# Altium integrated library WE_WR-MPC4_Mini Power Connector_4.20 mm_rev15b.IntLib: 79 symbols
Pins are listed as number, name and electrical type; pins without a type are passive.

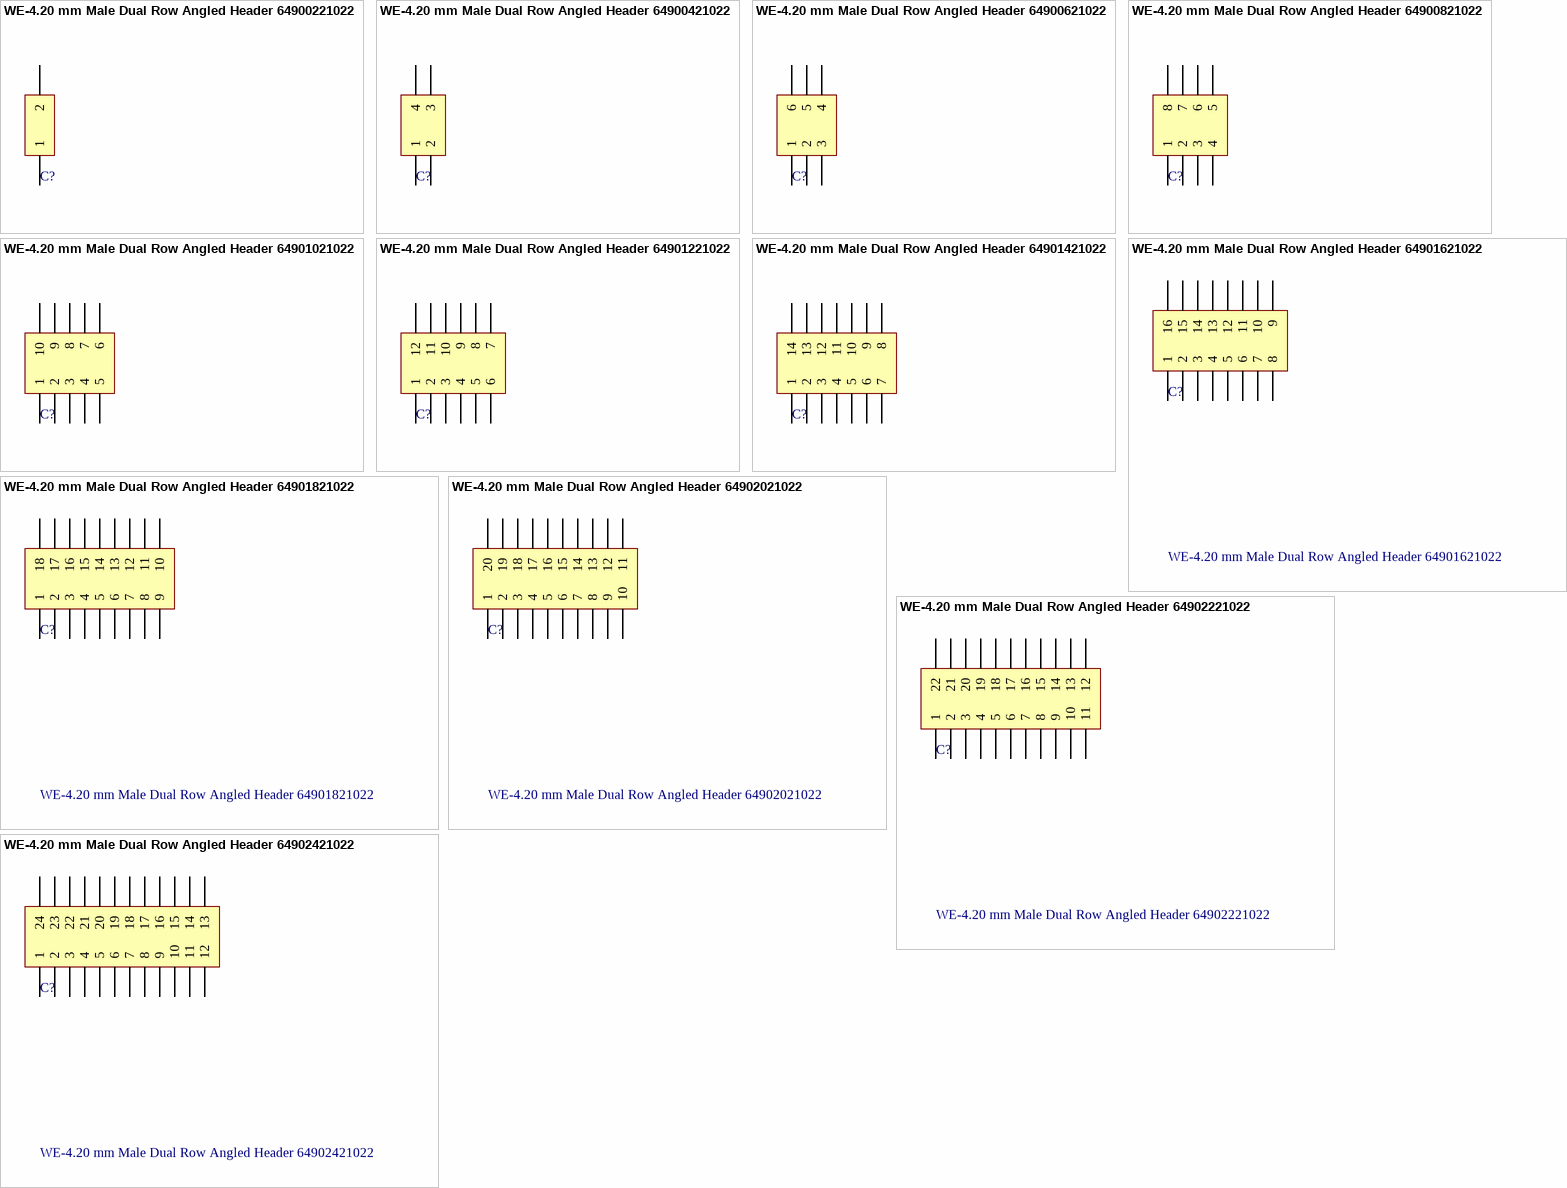
[diagram p0: symbols WE-4.20 mm Male Dual Row Angled Header 64900221022 to WE-4.20 mm Male Dual Row Angled Header 64902421022]

## WE-4.20 mm Male Dual Row Angled Header 64900221022
designator C?
WR-MPC4 Mini power connector; Manufacturer: Würth Elektronik eiSos GmbH; ComponentLink1 Description: Manufacturer; ComponentLink2 Description: Datasheet; NoPins: 02; Created Date: 5 August 2013; partNo: 64900221022; ComponentLink1URL: http://www.we-online.com; ComponentLink2URL: http://katalog.we-online.de/em/datasheet/6490xx21022.pdf; Created by: Karrer Zheng
footprint 64900221022 (Dual row Right angle header With mounting flanges 02p)
pins: 1, 2

## WE-4.20 mm Male Dual Row Angled Header 64900421022
designator C?
WR-MPC4 Mini power connector; Manufacturer: Würth Elektronik eiSos GmbH; ComponentLink1 Description: Manufacturer; ComponentLink2 Description: Datasheet; NoPins: 04; Created Date: 5 August 2013; partNo: 64900421022; ComponentLink1URL: http://www.we-online.com; ComponentLink2URL: http://katalog.we-online.de/em/datasheet/6490xx21022.pdf; Created by: Karrer Zheng
footprint 64900421022 (Dual row Right angle header With mounting flanges 04p)
pins: 1, 2, 3, 4

## WE-4.20 mm Male Dual Row Angled Header 64900621022
designator C?
WR-MPC4 Mini power connector; Manufacturer: Würth Elektronik eiSos GmbH; ComponentLink1 Description: Manufacturer; ComponentLink2 Description: Datasheet; NoPins: 06; Created Date: 5 August 2013; partNo: 64900621022; ComponentLink1URL: http://www.we-online.com; ComponentLink2URL: http://katalog.we-online.de/em/datasheet/6490xx21022.pdf; Created by: Karrer Zheng
footprint 64900621022 (Dual row Right angle header With mounting flanges 06p)
pins: 1, 2, 3, 4, 5, 6

## WE-4.20 mm Male Dual Row Angled Header 64900821022
designator C?
WR-MPC4 Mini power connector; Manufacturer: Würth Elektronik eiSos GmbH; ComponentLink1 Description: Manufacturer; ComponentLink2 Description: Datasheet; NoPins: 08; Created Date: 5 August 2013; partNo: 64900821022; ComponentLink1URL: http://www.we-online.com; ComponentLink2URL: http://katalog.we-online.de/em/datasheet/6490xx21022.pdf; Created by: Karrer Zheng
footprint 64900821022 (Dual row Right angle header With mounting flanges 08p)
pins: 1, 2, 3, 4, 5, 6, 7, 8

## WE-4.20 mm Male Dual Row Angled Header 64901021022
designator C?
WR-MPC4 Mini power connector; Manufacturer: Würth Elektronik eiSos GmbH; ComponentLink1 Description: Manufacturer; ComponentLink2 Description: Datasheet; NoPins: 10; Created Date: 5 August 2013; partNo: 64901021022; ComponentLink1URL: http://www.we-online.com; ComponentLink2URL: http://katalog.we-online.de/em/datasheet/6490xx21022.pdf; Created by: Karrer Zheng
footprint 64901021022 (Dual row Right angle header With mounting flanges 10p)
pins: 1, 2, 3, 4, 5, 6, 7, 8, 9, 10

## WE-4.20 mm Male Dual Row Angled Header 64901221022
designator C?
WR-MPC4 Mini power connector; Manufacturer: Würth Elektronik eiSos GmbH; ComponentLink1 Description: Manufacturer; ComponentLink2 Description: Datasheet; NoPins: 12; Created Date: 5 August 2013; partNo: 64901221022; ComponentLink1URL: http://www.we-online.com; ComponentLink2URL: http://katalog.we-online.de/em/datasheet/6490xx21022.pdf; Created by: Karrer Zheng
footprint 64901221022 (Dual row Right angle header With mounting flanges 12p)
pins: 1, 2, 3, 4, 5, 6, 7, 8, 9, 10, 11, 12

## WE-4.20 mm Male Dual Row Angled Header 64901421022
designator C?
WR-MPC4 Mini power connector; Manufacturer: Würth Elektronik eiSos GmbH; ComponentLink1 Description: Manufacturer; ComponentLink2 Description: Datasheet; NoPins: 14; Created Date: 5 August 2013; partNo: 64901421022; ComponentLink1URL: http://www.we-online.com; ComponentLink2URL: http://katalog.we-online.de/em/datasheet/6490xx21022.pdf; Created by: Karrer Zheng
footprint 64901421022 (Dual row Right angle header With mounting flanges 14p)
pins: 1, 2, 3, 4, 5, 6, 7, 8, 9, 10, 11, 12, 13, 14

## WE-4.20 mm Male Dual Row Angled Header 64901621022
designator C?
WR-MPC4 Mini power connector; Manufacturer: Würth Elektronik eiSos GmbH; ComponentLink1 Description: Manufacturer; ComponentLink2 Description: Datasheet; NoPins: 16; Created Date: 5 August 2013; partNo: 64901621022; ComponentLink1URL: http://www.we-online.com; ComponentLink2URL: http://katalog.we-online.de/em/datasheet/6490xx21022.pdf; Created by: Karrer Zheng
footprint 64901621022 (Dual row Right angle header With mounting flanges 16p)
pins: 1, 2, 3, 4, 5, 6, 7, 8, 9, 10, 11, 12, 13, 14, 15, 16

## WE-4.20 mm Male Dual Row Angled Header 64901821022
designator C?
WR-MPC4 Mini power connector; Manufacturer: Würth Elektronik eiSos GmbH; ComponentLink1 Description: Manufacturer; ComponentLink2 Description: Datasheet; NoPins: 18; Created Date: 5 August 2013; partNo: 64901821022; ComponentLink1URL: http://www.we-online.com; ComponentLink2URL: http://katalog.we-online.de/em/datasheet/6490xx21022.pdf; Created by: Karrer Zheng
footprint 64901821022 (Dual row Right angle header With mounting flanges 18p)
pins: 1, 2, 3, 4, 5, 6, 7, 8, 9, 10, 11, 12, 13, 14, 15, 16, 17, 18

## WE-4.20 mm Male Dual Row Angled Header 64902021022
designator C?
WR-MPC4 Mini power connector; Manufacturer: Würth Elektronik eiSos GmbH; ComponentLink1 Description: Manufacturer; ComponentLink2 Description: Datasheet; NoPins: 20; Created Date: 5 August 2013; partNo: 64902021022; ComponentLink1URL: http://www.we-online.com; ComponentLink2URL: http://katalog.we-online.de/em/datasheet/6490xx21022.pdf; Created by: Karrer Zheng
footprint 64902021022 (Dual row Right angle header With mounting flanges 20p)
pins: 1, 2, 3, 4, 5, 6, 7, 8, 9, 10, 11, 12, 13, 14, 15, 16, 17, 18, 19, 20

## WE-4.20 mm Male Dual Row Angled Header 64902221022
designator C?
WR-MPC4 Mini power connector; Manufacturer: Würth Elektronik eiSos GmbH; ComponentLink1 Description: Manufacturer; ComponentLink2 Description: Datasheet; NoPins: 22; Created Date: 5 August 2013; partNo: 64902221022; ComponentLink1URL: http://www.we-online.com; ComponentLink2URL: http://katalog.we-online.de/em/datasheet/6490xx21022.pdf; Created by: Karrer Zheng
footprint 64902221022 (Dual row Right angle header With mounting flanges 22p)
pins: 1, 2, 3, 4, 5, 6, 7, 8, 9, 10, 11, 12, 13, 14, 15, 16, 17, 18, 19, 20, 21, 22

## WE-4.20 mm Male Dual Row Angled Header 64902421022
designator C?
WR-MPC4 Mini power connector; Manufacturer: Würth Elektronik eiSos GmbH; ComponentLink1 Description: Manufacturer; ComponentLink2 Description: Datasheet; NoPins: 24; Created Date: 5 August 2013; partNo: 64902421022; ComponentLink1URL: http://www.we-online.com; ComponentLink2URL: http://katalog.we-online.de/em/datasheet/6490xx21022.pdf; Created by: Karrer Zheng
footprint 64902421022 (Dual row Right angle header With mounting flanges 24p)
pins: 1, 2, 3, 4, 5, 6, 7, 8, 9, 10, 11, 12, 13, 14, 15, 16, 17, 18, 19, 20, 21, 22, 23, 24


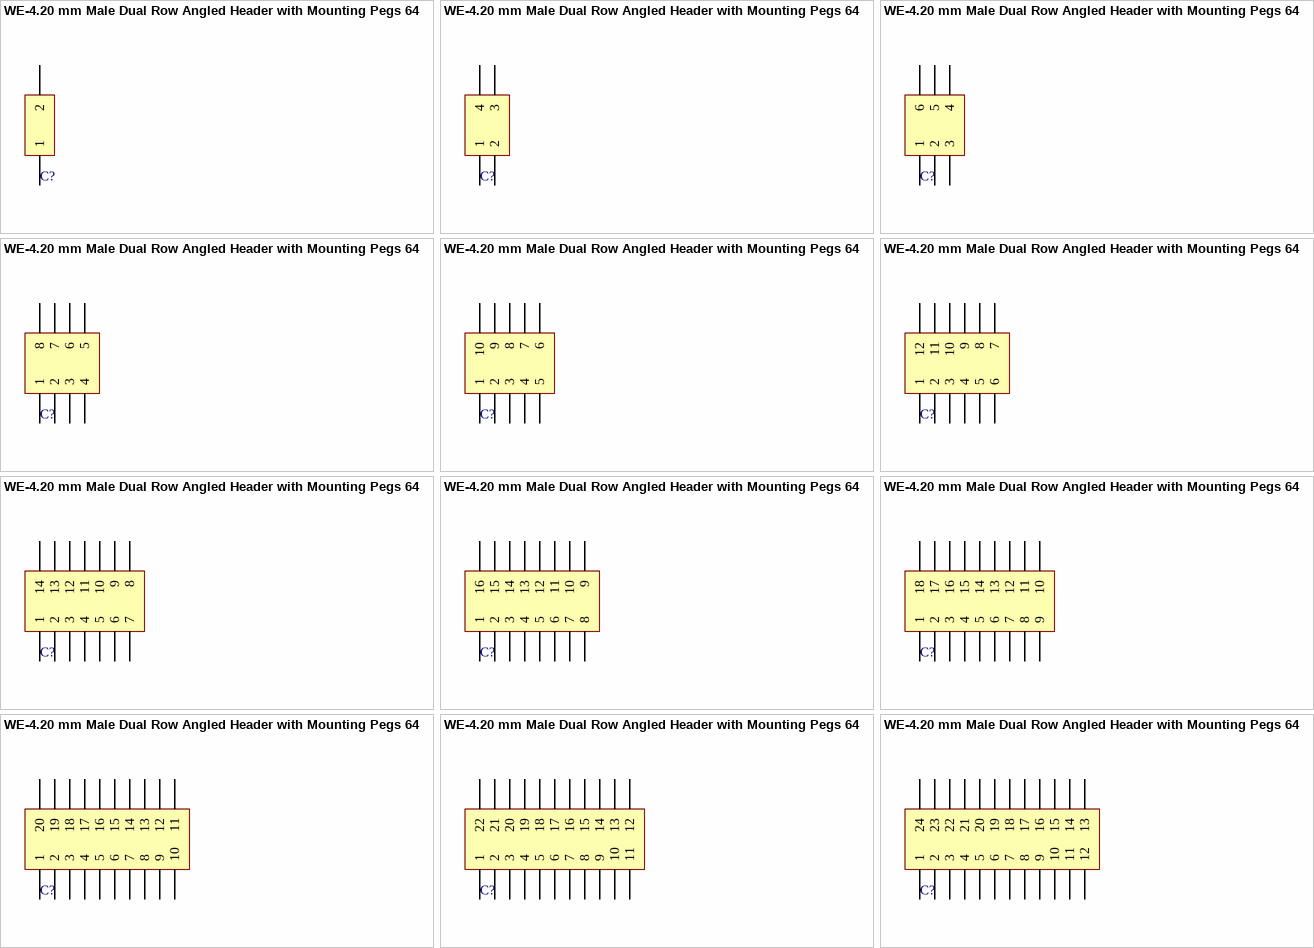
[diagram p1: symbols WE-4.20 mm Male Dual Row Angled Header with Mounting Pegs 649002227222 to WE-4.20 mm Male Dual Row Angled Header with Mounting Pegs 649024227222]

## WE-4.20 mm Male Dual Row Angled Header with Mounting Pegs 649002227222
designator C?
WR-MPC4 Mini power connector; Manufacturer: Würth Elektronik eiSos GmbH; ComponentLink1 Description: Manufacturer; ComponentLink2 Description: Datasheet; NoPins: 02; Created Date: 17 July 2013; partNo: 649002227222; ComponentLink1URL: http://www.we-online.com; ComponentLink2URL: http://katalog.we-online.de/em/datasheet/6490xx227222.pdf; Created by: Karrer Zheng
footprint 649002227222 (Dual Row Right angle header With mounting pegs 02p)
pins: 1, 2

## WE-4.20 mm Male Dual Row Angled Header with Mounting Pegs 649004227222
designator C?
WR-MPC4 Mini power connector; Manufacturer: Würth Elektronik eiSos GmbH; ComponentLink1 Description: Manufacturer; ComponentLink2 Description: Datasheet; NoPins: 04; Created Date: 17 July 2013; partNo: 649004227222; ComponentLink1URL: http://www.we-online.com; ComponentLink2URL: http://katalog.we-online.de/em/datasheet/6490xx227222.pdf; Created by: Karrer Zheng
footprint 649004227222 (Dual Row Right angle header With mounting pegs 04p)
pins: 1, 2, 3, 4

## WE-4.20 mm Male Dual Row Angled Header with Mounting Pegs 649006227222
designator C?
WR-MPC4 Mini power connector; Manufacturer: Würth Elektronik eiSos GmbH; ComponentLink1 Description: Manufacturer; ComponentLink2 Description: Datasheet; NoPins: 06; Created Date: 17 July 2013; partNo: 649006227222; ComponentLink1URL: http://www.we-online.com; ComponentLink2URL: http://katalog.we-online.de/em/datasheet/6490xx227222.pdf; Created by: Karrer Zheng
footprint 649006227222 (Dual Row Right angle header With mounting pegs 06p)
pins: 1, 2, 3, 4, 5, 6

## WE-4.20 mm Male Dual Row Angled Header with Mounting Pegs 649008227222
designator C?
WR-MPC4 Mini power connector; Manufacturer: Würth Elektronik eiSos GmbH; ComponentLink1 Description: Manufacturer; ComponentLink2 Description: Datasheet; NoPins: 08; Created Date: 17 July 2013; partNo: 649008227222; ComponentLink1URL: http://www.we-online.com; ComponentLink2URL: http://katalog.we-online.de/em/datasheet/6490xx227222.pdf; Created by: Karrer Zheng
footprint 649008227222 (Dual Row Right angle header With mounting pegs 08p)
pins: 1, 2, 3, 4, 5, 6, 7, 8

## WE-4.20 mm Male Dual Row Angled Header with Mounting Pegs 649010227222
designator C?
WR-MPC4 Mini power connector; Manufacturer: Würth Elektronik eiSos GmbH; ComponentLink1 Description: Manufacturer; ComponentLink2 Description: Datasheet; NoPins: 10; Created Date: 17 July 2013; partNo: 649010227222; ComponentLink1URL: http://www.we-online.com; ComponentLink2URL: http://katalog.we-online.de/em/datasheet/6490xx227222.pdf; Created by: Karrer Zheng
footprint 649010227222 (Dual Row Right angle header With mounting pegs 10p)
pins: 1, 2, 3, 4, 5, 6, 7, 8, 9, 10

## WE-4.20 mm Male Dual Row Angled Header with Mounting Pegs 649012227222
designator C?
WR-MPC4 Mini power connector; Manufacturer: Würth Elektronik eiSos GmbH; ComponentLink1 Description: Manufacturer; ComponentLink2 Description: Datasheet; NoPins: 12; Created Date: 17 July 2013; partNo: 649012227222; ComponentLink1URL: http://www.we-online.com; ComponentLink2URL: http://katalog.we-online.de/em/datasheet/6490xx227222.pdf; Created by: Karrer Zheng
footprint 649012227222 (Dual Row Right angle header With mounting pegs 12p)
pins: 1, 2, 3, 4, 5, 6, 7, 8, 9, 10, 11, 12

## WE-4.20 mm Male Dual Row Angled Header with Mounting Pegs 649014227222
designator C?
WR-MPC4 Mini power connector; Manufacturer: Würth Elektronik eiSos GmbH; ComponentLink1 Description: Manufacturer; ComponentLink2 Description: Datasheet; NoPins: 14; Created Date: 17 July 2013; partNo: 649014227222; ComponentLink1URL: http://www.we-online.com; ComponentLink2URL: http://katalog.we-online.de/em/datasheet/6490xx227222.pdf; Created by: Karrer Zheng
footprint 649014227222 (Dual Row Right angle header With mounting pegs 14p)
pins: 1, 2, 3, 4, 5, 6, 7, 8, 9, 10, 11, 12, 13, 14

## WE-4.20 mm Male Dual Row Angled Header with Mounting Pegs 649016227222
designator C?
WR-MPC4 Mini power connector; Manufacturer: Würth Elektronik eiSos GmbH; ComponentLink1 Description: Manufacturer; ComponentLink2 Description: Datasheet; NoPins: 16; Created Date: 17 July 2013; partNo: 649016227222; ComponentLink1URL: http://www.we-online.com; ComponentLink2URL: http://katalog.we-online.de/em/datasheet/6490xx227222.pdf; Created by: Karrer Zheng
footprint 649016227222 (Dual Row Right angle header With mounting pegs 16p)
pins: 1, 2, 3, 4, 5, 6, 7, 8, 9, 10, 11, 12, 13, 14, 15, 16

## WE-4.20 mm Male Dual Row Angled Header with Mounting Pegs 649018227222
designator C?
WR-MPC4 Mini power connector; Manufacturer: Würth Elektronik eiSos GmbH; ComponentLink1 Description: Manufacturer; ComponentLink2 Description: Datasheet; NoPins: 18; Created Date: 17 July 2013; partNo: 649018227222; ComponentLink1URL: http://www.we-online.com; ComponentLink2URL: http://katalog.we-online.de/em/datasheet/6490xx227222.pdf; Created by: Karrer Zheng
footprint 649018227222 (Dual Row Right angle header With mounting pegs 18p)
pins: 1, 2, 3, 4, 5, 6, 7, 8, 9, 10, 11, 12, 13, 14, 15, 16, 17, 18

## WE-4.20 mm Male Dual Row Angled Header with Mounting Pegs 649020227222
designator C?
WR-MPC4 Mini power connector; Manufacturer: Würth Elektronik eiSos GmbH; ComponentLink1 Description: Manufacturer; ComponentLink2 Description: Datasheet; NoPins: 20; Created Date: 17 July 2013; partNo: 649020227222; ComponentLink1URL: http://www.we-online.com; ComponentLink2URL: http://katalog.we-online.de/em/datasheet/6490xx227222.pdf; Created by: Karrer Zheng
footprint 649020227222 (Dual Row Right angle header With mounting pegs 20p)
pins: 1, 2, 3, 4, 5, 6, 7, 8, 9, 10, 11, 12, 13, 14, 15, 16, 17, 18, 19, 20

## WE-4.20 mm Male Dual Row Angled Header with Mounting Pegs 649022227222
designator C?
WR-MPC4 Mini power connector; Manufacturer: Würth Elektronik eiSos GmbH; ComponentLink1 Description: Manufacturer; ComponentLink2 Description: Datasheet; NoPins: 22; Created Date: 17 July 2013; partNo: 649022227222; ComponentLink1URL: http://www.we-online.com; ComponentLink2URL: http://katalog.we-online.de/em/datasheet/6490xx227222.pdf; Created by: Karrer Zheng
footprint 649022227222 (Dual Row Right angle header With mounting pegs 22p)
pins: 1, 2, 3, 4, 5, 6, 7, 8, 9, 10, 11, 12, 13, 14, 15, 16, 17, 18, 19, 20, 21, 22

## WE-4.20 mm Male Dual Row Angled Header with Mounting Pegs 649024227222
designator C?
WR-MPC4 Mini power connector; Manufacturer: Würth Elektronik eiSos GmbH; ComponentLink1 Description: Manufacturer; ComponentLink2 Description: Datasheet; NoPins: 24; Created Date: 17 July 2013; partNo: 649024227222; ComponentLink1URL: http://www.we-online.com; ComponentLink2URL: http://katalog.we-online.de/em/datasheet/6490xx227222.pdf; Created by: Karrer Zheng
footprint 649024227222 (Dual Row Right angle header With mounting pegs 24p)
pins: 1, 2, 3, 4, 5, 6, 7, 8, 9, 10, 11, 12, 13, 14, 15, 16, 17, 18, 19, 20, 21, 22, 23, 24


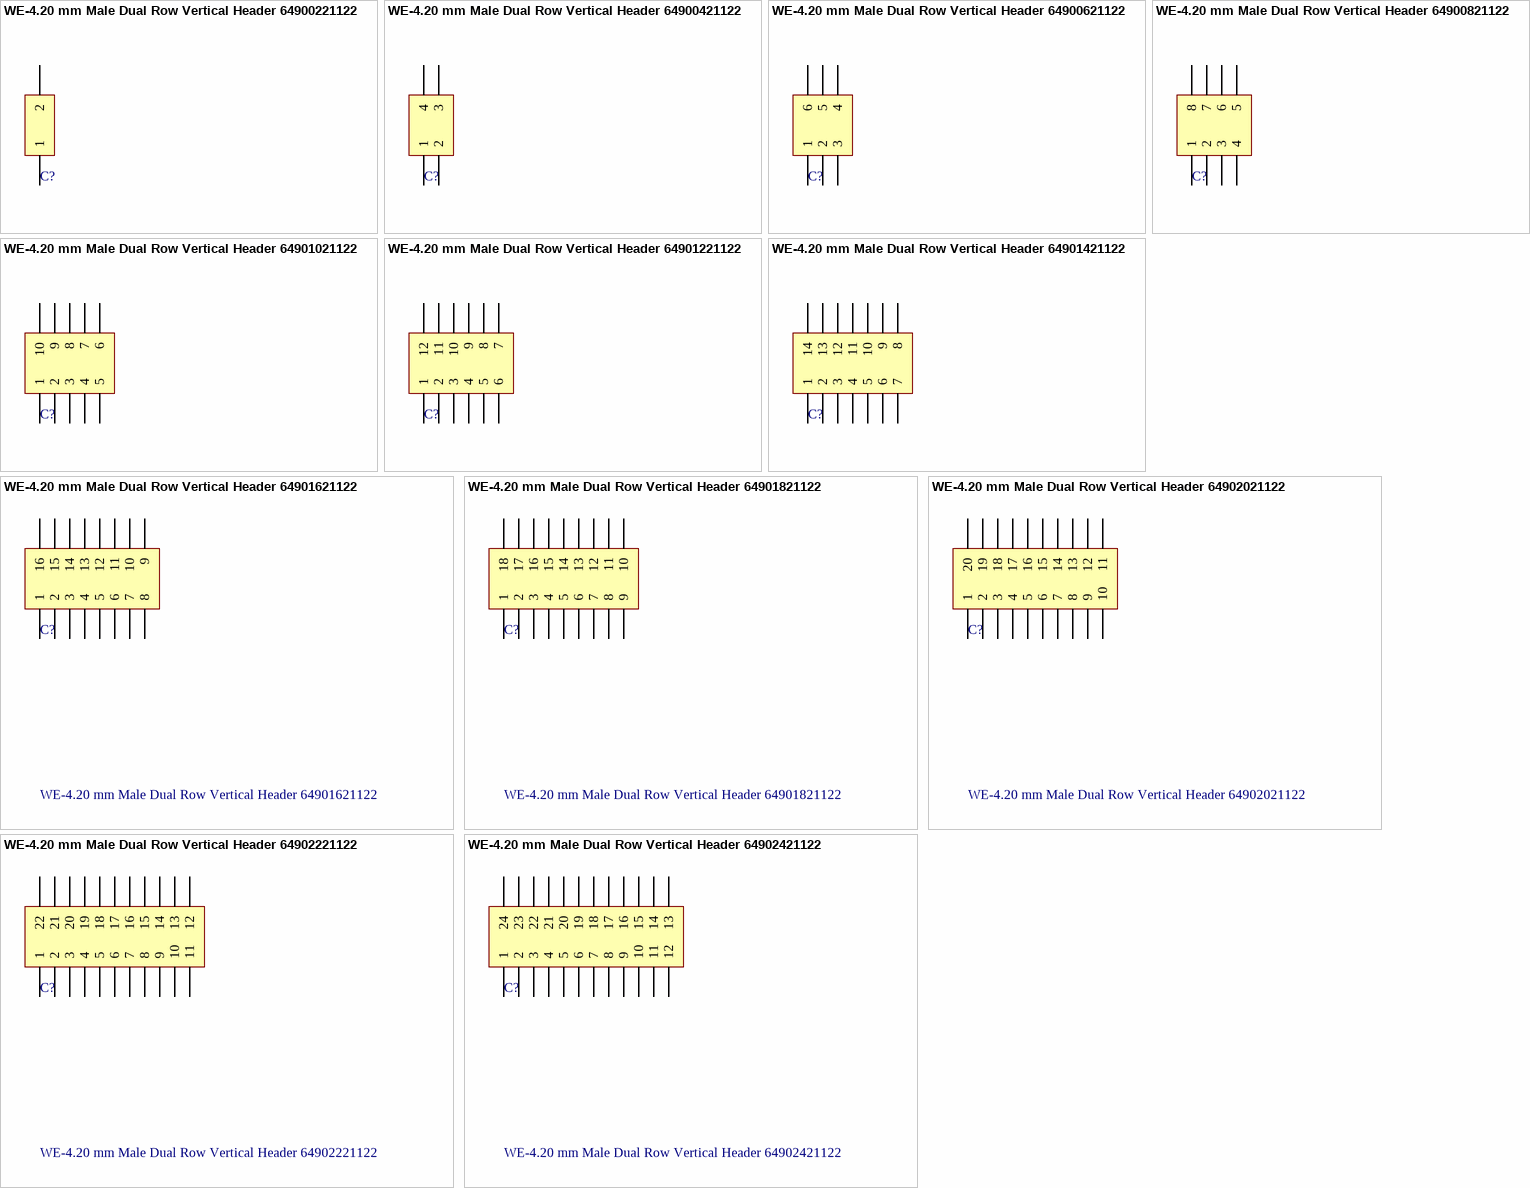
[diagram p2: symbols WE-4.20 mm Male Dual Row Vertical Header 64900221122 to WE-4.20 mm Male Dual Row Vertical Header 64902421122]

## WE-4.20 mm Male Dual Row Vertical Header 64900221122
designator C?
WR-MPC4 Mini power connector; Manufacturer: Würth Elektronik eiSos GmbH; ComponentLink1 Description: Manufacturer; ComponentLink2 Description: Datasheet; NoPins: 2; Created Date: 21 June 2013; partNo: 64900221122; ComponentLink1URL: http://www.we-online.com; ComponentLink2URL: http://katalog.we-online.de/em/datasheet/6490xx21122.pdf; Created by: Karrer Zheng
footprint 64900221122 (Dual row Vertical header 02p)
pins: 1, 2

## WE-4.20 mm Male Dual Row Vertical Header 64900421122
designator C?
WR-MPC4 Mini power connector; Manufacturer: Würth Elektronik eiSos GmbH; ComponentLink1 Description: Manufacturer; ComponentLink2 Description: Datasheet; NoPins: 4; Created Date: 21 June 2013; partNo: 64900421122; ComponentLink1URL: http://www.we-online.com; ComponentLink2URL: http://katalog.we-online.de/em/datasheet/6490xx21122.pdf; Created by: Karrer Zheng
footprint 64900421122 (Dual row Vertical header 04p)
pins: 1, 2, 3, 4

## WE-4.20 mm Male Dual Row Vertical Header 64900621122
designator C?
WR-MPC4 Mini power connector; Manufacturer: Würth Elektronik eiSos GmbH; ComponentLink1 Description: Manufacturer; ComponentLink2 Description: Datasheet; NoPins: 6; Created Date: 21 June 2013; partNo: 64900621122; ComponentLink1URL: http://www.we-online.com; ComponentLink2URL: http://katalog.we-online.de/em/datasheet/6490xx21122.pdf; Created by: Karrer Zheng
footprint 64900621122 (Dual row Vertical header 06p)
pins: 1, 2, 3, 4, 5, 6

## WE-4.20 mm Male Dual Row Vertical Header 64900821122
designator C?
WR-MPC4 Mini power connector; Manufacturer: Würth Elektronik eiSos GmbH; ComponentLink1 Description: Manufacturer; ComponentLink2 Description: Datasheet; NoPins: 8; Created Date: 21 June 2013; partNo: 64900821122; ComponentLink1URL: http://www.we-online.com; ComponentLink2URL: http://katalog.we-online.de/em/datasheet/6490xx21122.pdf; Created by: Karrer Zheng
footprint 64900821122 (Dual row Vertical header 08p)
pins: 1, 2, 3, 4, 5, 6, 7, 8

## WE-4.20 mm Male Dual Row Vertical Header 64901021122
designator C?
WR-MPC4 Mini power connector; Manufacturer: Würth Elektronik eiSos GmbH; ComponentLink1 Description: Manufacturer; ComponentLink2 Description: Datasheet; NoPins: 10; Created Date: 21 June 2013; partNo: 64901021122; ComponentLink1URL: http://www.we-online.com; ComponentLink2URL: http://katalog.we-online.de/em/datasheet/6490xx21122.pdf; Created by: Karrer Zheng
footprint 64901021122 (Dual row Vertical header 10p)
pins: 1, 2, 3, 4, 5, 6, 7, 8, 9, 10

## WE-4.20 mm Male Dual Row Vertical Header 64901221122
designator C?
WR-MPC4 Mini power connector; Manufacturer: Würth Elektronik eiSos GmbH; ComponentLink1 Description: Manufacturer; ComponentLink2 Description: Datasheet; NoPins: 12; Created Date: 21 June 2013; partNo: 64901221122; ComponentLink1URL: http://www.we-online.com; ComponentLink2URL: http://katalog.we-online.de/em/datasheet/6490xx21122.pdf; Created by: Karrer Zheng
footprint 64901221122 (Dual row Vertical header 12p)
pins: 1, 2, 3, 4, 5, 6, 7, 8, 9, 10, 11, 12

## WE-4.20 mm Male Dual Row Vertical Header 64901421122
designator C?
WR-MPC4 Mini power connector; Manufacturer: Würth Elektronik eiSos GmbH; ComponentLink1 Description: Manufacturer; ComponentLink2 Description: Datasheet; NoPins: 14; Created Date: 21 June 2013; partNo: 64901421122; ComponentLink1URL: http://www.we-online.com; ComponentLink2URL: http://katalog.we-online.de/em/datasheet/6490xx21122.pdf; Created by: Karrer Zheng
footprint 64901421122 (Dual row Vertical header 14p)
pins: 1, 2, 3, 4, 5, 6, 7, 8, 9, 10, 11, 12, 13, 14

## WE-4.20 mm Male Dual Row Vertical Header 64901621122
designator C?
WR-MPC4 Mini power connector; Manufacturer: Würth Elektronik eiSos GmbH; ComponentLink1 Description: Manufacturer; ComponentLink2 Description: Datasheet; NoPins: 16; Created Date: 21 June 2013; partNo: 64901621122; ComponentLink1URL: http://www.we-online.com; ComponentLink2URL: http://katalog.we-online.de/em/datasheet/6490xx21122.pdf; Created by: Karrer Zheng
footprint 64901621122 (Dual row Vertical header 16p)
pins: 1, 2, 3, 4, 5, 6, 7, 8, 9, 10, 11, 12, 13, 14, 15, 16

## WE-4.20 mm Male Dual Row Vertical Header 64901821122
designator C?
WR-MPC4 Mini power connector; Manufacturer: Würth Elektronik eiSos GmbH; ComponentLink1 Description: Manufacturer; ComponentLink2 Description: Datasheet; NoPins: 18; Created Date: 21 June 2013; partNo: 64901821122; ComponentLink1URL: http://www.we-online.com; ComponentLink2URL: http://katalog.we-online.de/em/datasheet/6490xx21122.pdf; Created by: Karrer Zheng
footprint 64901821122 (Dual row Vertical header 18p)
pins: 1, 2, 3, 4, 5, 6, 7, 8, 9, 10, 11, 12, 13, 14, 15, 16, 17, 18

## WE-4.20 mm Male Dual Row Vertical Header 64902021122
designator C?
WR-MPC4 Mini power connector; Manufacturer: Würth Elektronik eiSos GmbH; ComponentLink1 Description: Manufacturer; ComponentLink2 Description: Datasheet; NoPins: 20; Created Date: 21 June 2013; partNo: 64902021122; ComponentLink1URL: http://www.we-online.com; ComponentLink2URL: http://katalog.we-online.de/em/datasheet/6490xx21122.pdf; Created by: Karrer Zheng
footprint 64902021122 (Dual row Vertical header 20p)
pins: 1, 2, 3, 4, 5, 6, 7, 8, 9, 10, 11, 12, 13, 14, 15, 16, 17, 18, 19, 20

## WE-4.20 mm Male Dual Row Vertical Header 64902221122
designator C?
WR-MPC4 Mini power connector; Manufacturer: Würth Elektronik eiSos GmbH; ComponentLink1 Description: Manufacturer; ComponentLink2 Description: Datasheet; NoPins: 22; Created Date: 21 June 2013; partNo: 64902221122; ComponentLink1URL: http://www.we-online.com; ComponentLink2URL: http://katalog.we-online.de/em/datasheet/6490xx21122.pdf; Created by: Karrer Zheng
footprint 64902221122 (Dual row Vertical header 22p)
pins: 1, 2, 3, 4, 5, 6, 7, 8, 9, 10, 11, 12, 13, 14, 15, 16, 17, 18, 19, 20, 21, 22

## WE-4.20 mm Male Dual Row Vertical Header 64902421122
designator C?
WR-MPC4 Mini power connector; Manufacturer: Würth Elektronik eiSos GmbH; ComponentLink1 Description: Manufacturer; ComponentLink2 Description: Datasheet; NoPins: 24; Created Date: 21 June 2013; partNo: 64902421122; ComponentLink1URL: http://www.we-online.com; ComponentLink2URL: http://katalog.we-online.de/em/datasheet/6490xx21122.pdf; Created by: Karrer Zheng
footprint 64902421122 (Dual row Vertical header 24p)
pins: 1, 2, 3, 4, 5, 6, 7, 8, 9, 10, 11, 12, 13, 14, 15, 16, 17, 18, 19, 20, 21, 22, 23, 24

